# Altium schematic symbol library Regulator_Linear.SchLib: 1538 symbols (part 1 of 9) (continued)
## AP2127N-1.5
designator *  value AP2127N-1.5  Reference: U
ki_keywords: linear regulator ldo fixed positive; ki_description: 300mA low dropout linear regulator, shutdown pin, 2.5V-6V input voltage, 1.5V fixed positive output, SOT-23 package; ki_fp_filters: SOT?23*; Footprint: Package_TO_SOT_SMD:SOT-23; Datasheet: https://www.diodes.com/assets/Datasheets/AP2127.pdf
pins: 1 GND, 2 VO, 3 VI

## AP2127N-1.8
designator *  value AP2127N-1.8  Reference: U
ki_keywords: linear regulator ldo fixed positive; ki_description: 300mA low dropout linear regulator, shutdown pin, 2.5V-6V input voltage, 1.8V fixed positive output, SOT-23 package; ki_fp_filters: SOT?23*; Footprint: Package_TO_SOT_SMD:SOT-23; Datasheet: https://www.diodes.com/assets/Datasheets/AP2127.pdf
pins: 1 GND, 2 VO, 3 VI

## AP2127N-2.5
designator *  value AP2127N-2.5  Reference: U
ki_keywords: linear regulator ldo fixed positive; ki_description: 300mA low dropout linear regulator, shutdown pin, 2.5V-6V input voltage, 2.5V fixed positive output, SOT-23 package; ki_fp_filters: SOT?23*; Footprint: Package_TO_SOT_SMD:SOT-23; Datasheet: https://www.diodes.com/assets/Datasheets/AP2127.pdf
pins: 1 GND, 2 VO, 3 VI

## AP2127N-2.8
designator *  value AP2127N-2.8  Reference: U
ki_keywords: linear regulator ldo fixed positive; ki_description: 300mA low dropout linear regulator, shutdown pin, 2.5V-6V input voltage, 2.8V fixed positive output, SOT-23 package; ki_fp_filters: SOT?23*; Footprint: Package_TO_SOT_SMD:SOT-23; Datasheet: https://www.diodes.com/assets/Datasheets/AP2127.pdf
pins: 1 GND, 2 VO, 3 VI

## AP2127N-3.0
designator *  value AP2127N-3.0  Reference: U
ki_keywords: linear regulator ldo fixed positive; ki_description: 300mA low dropout linear regulator, shutdown pin, 2.5V-6V input voltage, 3.0V fixed positive output, SOT-23 package; ki_fp_filters: SOT?23*; Footprint: Package_TO_SOT_SMD:SOT-23; Datasheet: https://www.diodes.com/assets/Datasheets/AP2127.pdf
pins: 1 GND, 2 VO, 3 VI

## AP2127N-3.3
designator *  value AP2127N-3.3  Reference: U
ki_keywords: linear regulator ldo fixed positive; ki_description: 300mA low dropout linear regulator, shutdown pin, 2.5V-6V input voltage, 3.3V fixed positive output, SOT-23 package; ki_fp_filters: SOT?23*; Footprint: Package_TO_SOT_SMD:SOT-23; Datasheet: https://www.diodes.com/assets/Datasheets/AP2127.pdf
pins: 1 GND, 2 VO, 3 VI

## AP2127R-3.3
designator *  value AP2127R-3.3  Reference: U
ki_keywords: linear regulator ldo fixed positive; ki_description: 300mA low dropout linear regulator, shutdown pin, 2.5V-6V input voltage, 3.3V fixed positive output, SOT-89 package; ki_fp_filters: SOT?89*; Footprint: Package_TO_SOT_SMD:SOT-89-3; Datasheet: https://www.diodes.com/assets/Datasheets/AP2127.pdf
pins: 1 GND, 2 VI, 3 VO

## AP2204K-1.5
designator *  value AP2204K-1.5  Reference: U
ki_keywords: linear regulator ldo fixed positive; ki_description: 150mA low dropout linear regulator, wide input voltage range, 1.5V fixed positive output, SOT-23-5; ki_fp_filters: SOT?23?5*; Footprint: Package_TO_SOT_SMD:SOT-23-5; Datasheet: https://www.diodes.com/assets/Datasheets/AP2204.pdf
pins: 1 VIN, 2 GND, 3 EN, 4 NC hidden, 5 VOUT

## AP2204K-1.8
designator *  value AP2204K-1.8  Reference: U
ki_keywords: linear regulator ldo fixed positive; ki_description: 150mA low dropout linear regulator, wide input voltage range, 1.8V fixed positive output, SOT-23-5; ki_fp_filters: SOT?23?5*; Footprint: Package_TO_SOT_SMD:SOT-23-5; Datasheet: https://www.diodes.com/assets/Datasheets/AP2204.pdf
pins: 1 VIN, 2 GND, 3 EN, 4 NC hidden, 5 VOUT

## AP2204K-2.5
designator *  value AP2204K-2.5  Reference: U
ki_keywords: linear regulator ldo fixed positive; ki_description: 150mA low dropout linear regulator, wide input voltage range, 2.5V fixed positive output, SOT-23-5; ki_fp_filters: SOT?23?5*; Footprint: Package_TO_SOT_SMD:SOT-23-5; Datasheet: https://www.diodes.com/assets/Datasheets/AP2204.pdf
pins: 1 VIN, 2 GND, 3 EN, 4 NC hidden, 5 VOUT

## AP2204K-2.8
designator *  value AP2204K-2.8  Reference: U
ki_keywords: linear regulator ldo fixed positive; ki_description: 150mA low dropout linear regulator, wide input voltage range, 2.8V fixed positive output, SOT-23-5; ki_fp_filters: SOT?23?5*; Footprint: Package_TO_SOT_SMD:SOT-23-5; Datasheet: https://www.diodes.com/assets/Datasheets/AP2204.pdf
pins: 1 VIN, 2 GND, 3 EN, 4 NC hidden, 5 VOUT

## AP2204K-3.0
designator *  value AP2204K-3.0  Reference: U
ki_keywords: linear regulator ldo fixed positive; ki_description: 150mA low dropout linear regulator, wide input voltage range, 3.0V fixed positive output, SOT-23-5; ki_fp_filters: SOT?23?5*; Footprint: Package_TO_SOT_SMD:SOT-23-5; Datasheet: https://www.diodes.com/assets/Datasheets/AP2204.pdf
pins: 1 VIN, 2 GND, 3 EN, 4 NC hidden, 5 VOUT

## AP2204K-3.3
designator *  value AP2204K-3.3  Reference: U
ki_keywords: linear regulator ldo fixed positive; ki_description: 150mA low dropout linear regulator, wide input voltage range, 3.3V fixed positive output, SOT-23-5; ki_fp_filters: SOT?23?5*; Footprint: Package_TO_SOT_SMD:SOT-23-5; Datasheet: https://www.diodes.com/assets/Datasheets/AP2204.pdf
pins: 1 VIN, 2 GND, 3 EN, 4 NC hidden, 5 VOUT

## AP2204K-5.0
designator *  value AP2204K-5.0  Reference: U
ki_keywords: linear regulator ldo fixed positive; ki_description: 150mA low dropout linear regulator, wide input voltage range, 5.0V fixed positive output, SOT-23-5; ki_fp_filters: SOT?23?5*; Footprint: Package_TO_SOT_SMD:SOT-23-5; Datasheet: https://www.diodes.com/assets/Datasheets/AP2204.pdf
pins: 1 VIN, 2 GND, 3 EN, 4 NC hidden, 5 VOUT

## AP2204K-ADJ
designator *  value AP2204K-ADJ  Reference: U
ki_keywords: linear regulator ldo adjustable positive; ki_description: 150mA low dropout adjustable linear regulator, wide input voltage range, SOT-23-5 package; ki_fp_filters: SOT?23?5*; Footprint: Package_TO_SOT_SMD:SOT-23-5; Datasheet: https://www.diodes.com/assets/Datasheets/AP2204.pdf
pins: 1 VIN, 2 GND, 3 EN, 4 ADJ, 5 VOUT

## AP2204MP-ADJ
designator *  value AP2204MP-ADJ  Reference: U
ki_keywords: linear regulator ldo adjustable positive; ki_description: 150mA low dropout adjustable linear regulator, wide input voltage range, PSOP-8 package; ki_fp_filters: Diodes*PSOP*; Footprint: Package_SO:Diodes_PSOP-8; Datasheet: https://www.diodes.com/assets/Datasheets/AP2204.pdf
pins: 1 VOUT, 2 NC hidden, 3 NC hidden, 4 ADJ, 5 EN, 6 NC hidden, 7 GND, 8 VIN, 9 GND hidden

## AP2204R-1.5
designator *  value AP2204R-1.5  Reference: U
ki_keywords: linear regulator ldo fixed positive; ki_description: 150mA low dropout linear regulator, wide input voltage range, 1.5V fixed positive output, SOT-89-3 package; ki_fp_filters: SOT?89*; Footprint: Package_TO_SOT_SMD:SOT-89-3; Datasheet: https://www.diodes.com/assets/Datasheets/AP2204.pdf
pins: 1 VIN, 2 GND, 3 VOUT

## AP2204R-1.8
designator *  value AP2204R-1.8  Reference: U
ki_keywords: linear regulator ldo fixed positive; ki_description: 150mA low dropout linear regulator, wide input voltage range, 1.8V fixed positive output, SOT-89-3 package; ki_fp_filters: SOT?89*; Footprint: Package_TO_SOT_SMD:SOT-89-3; Datasheet: https://www.diodes.com/assets/Datasheets/AP2204.pdf
pins: 1 VIN, 2 GND, 3 VOUT

## AP2204R-2.5
designator *  value AP2204R-2.5  Reference: U
ki_keywords: linear regulator ldo fixed positive; ki_description: 150mA low dropout linear regulator, wide input voltage range, 2.5V fixed positive output, SOT-89-3 package; ki_fp_filters: SOT?89*; Footprint: Package_TO_SOT_SMD:SOT-89-3; Datasheet: https://www.diodes.com/assets/Datasheets/AP2204.pdf
pins: 1 VIN, 2 GND, 3 VOUT

## AP2204R-2.8
designator *  value AP2204R-2.8  Reference: U
ki_keywords: linear regulator ldo fixed positive; ki_description: 150mA low dropout linear regulator, wide input voltage range, 2.8V fixed positive output, SOT-89-3 package; ki_fp_filters: SOT?89*; Footprint: Package_TO_SOT_SMD:SOT-89-3; Datasheet: https://www.diodes.com/assets/Datasheets/AP2204.pdf
pins: 1 VIN, 2 GND, 3 VOUT

## AP2204R-3.0
designator *  value AP2204R-3.0  Reference: U
ki_keywords: linear regulator ldo fixed positive; ki_description: 150mA low dropout linear regulator, wide input voltage range, 3.0V fixed positive output, SOT-89-3 package; ki_fp_filters: SOT?89*; Footprint: Package_TO_SOT_SMD:SOT-89-3; Datasheet: https://www.diodes.com/assets/Datasheets/AP2204.pdf
pins: 1 VIN, 2 GND, 3 VOUT

## AP2204R-3.3
designator *  value AP2204R-3.3  Reference: U
ki_keywords: linear regulator ldo fixed positive; ki_description: 150mA low dropout linear regulator, wide input voltage range, 3.3V fixed positive output, SOT-89-3 package; ki_fp_filters: SOT?89*; Footprint: Package_TO_SOT_SMD:SOT-89-3; Datasheet: https://www.diodes.com/assets/Datasheets/AP2204.pdf
pins: 1 VIN, 2 GND, 3 VOUT

## AP2204R-5.0
designator *  value AP2204R-5.0  Reference: U
ki_keywords: linear regulator ldo fixed positive; ki_description: 150mA low dropout linear regulator, wide input voltage range, 5.0V fixed positive output, SOT-89-3 package; ki_fp_filters: SOT?89*; Footprint: Package_TO_SOT_SMD:SOT-89-3; Datasheet: https://www.diodes.com/assets/Datasheets/AP2204.pdf
pins: 1 VIN, 2 GND, 3 VOUT

## AP2204RA-3.3
designator *  value AP2204RA-3.3  Reference: U
ki_keywords: linear regulator ldo fixed positive; ki_description: 150mA low dropout linear regulator, wide input voltage range, 3.3V fixed positive output, SOT-89-3 package; ki_fp_filters: SOT?89*; Footprint: Package_TO_SOT_SMD:SOT-89-3; Datasheet: https://www.diodes.com/assets/Datasheets/AP2204.pdf
pins: 1 GND, 2 VIN, 3 VOUT

## AP2204RA-5.0
designator *  value AP2204RA-5.0  Reference: U
ki_keywords: linear regulator ldo fixed positive; ki_description: 150mA low dropout linear regulator, wide input voltage range, 5.0V fixed positive output, SOT-89-3 package; ki_fp_filters: SOT?89*; Footprint: Package_TO_SOT_SMD:SOT-89-3; Datasheet: https://www.diodes.com/assets/Datasheets/AP2204.pdf
pins: 1 GND, 2 VIN, 3 VOUT

## AP2204RB-3.3
designator *  value AP2204RB-3.3  Reference: U
ki_keywords: linear regulator ldo fixed positive; ki_description: 150mA low dropout linear regulator, wide input voltage range, 3.3V fixed positive output, SOT-89-3 package; ki_fp_filters: SOT?89*; Footprint: Package_TO_SOT_SMD:SOT-89-3; Datasheet: https://www.diodes.com/assets/Datasheets/AP2204.pdf
pins: 1 VOUT, 2 GND, 3 VIN

## AP2204RB-5.0
designator *  value AP2204RB-5.0  Reference: U
ki_keywords: linear regulator ldo fixed positive; ki_description: 150mA low dropout linear regulator, wide input voltage range, 5.0V fixed positive output, SOT-89-3 package; ki_fp_filters: SOT?89*; Footprint: Package_TO_SOT_SMD:SOT-89-3; Datasheet: https://www.diodes.com/assets/Datasheets/AP2204.pdf
pins: 1 VOUT, 2 GND, 3 VIN

## AP7361C-10E
designator *  value AP7361C-10E  Reference: U
ki_keywords: linear regulator ldo fixed positive; ki_description: 1A Low Dropout regulator, positive, 1.0V fixed output, SOT-223; ki_fp_filters: SOT?223*; Footprint: Package_TO_SOT_SMD:SOT-223-3_TabPin2; Datasheet: https://www.diodes.com/assets/Datasheets/AP7361C.pdf
pins: 1 VI, 2 GND, 3 VO

## AP7361C-12E
designator *  value AP7361C-12E  Reference: U
ki_keywords: linear regulator ldo fixed positive; ki_description: 1A Low Dropout regulator, positive, 1.2V fixed output, SOT-223; ki_fp_filters: SOT?223*; Footprint: Package_TO_SOT_SMD:SOT-223-3_TabPin2; Datasheet: https://www.diodes.com/assets/Datasheets/AP7361C.pdf
pins: 1 VI, 2 GND, 3 VO

## AP7361C-15E
designator *  value AP7361C-15E  Reference: U
ki_keywords: linear regulator ldo fixed positive; ki_description: 1A Low Dropout regulator, positive, 1.5V fixed output, SOT-223; ki_fp_filters: SOT?223*; Footprint: Package_TO_SOT_SMD:SOT-223-3_TabPin2; Datasheet: https://www.diodes.com/assets/Datasheets/AP7361C.pdf
pins: 1 VI, 2 GND, 3 VO

## AP7361C-18E
designator *  value AP7361C-18E  Reference: U
ki_keywords: linear regulator ldo fixed positive; ki_description: 1A Low Dropout regulator, positive, 1.8V fixed output, SOT-223; ki_fp_filters: SOT?223*; Footprint: Package_TO_SOT_SMD:SOT-223-3_TabPin2; Datasheet: https://www.diodes.com/assets/Datasheets/AP7361C.pdf
pins: 1 VI, 2 GND, 3 VO

## AP7361C-25E
designator *  value AP7361C-25E  Reference: U
ki_keywords: linear regulator ldo fixed positive; ki_description: 1A Low Dropout regulator, positive, 2.5V fixed output, SOT-223; ki_fp_filters: SOT?223*; Footprint: Package_TO_SOT_SMD:SOT-223-3_TabPin2; Datasheet: https://www.diodes.com/assets/Datasheets/AP7361C.pdf
pins: 1 VI, 2 GND, 3 VO

## AP7361C-28E
designator *  value AP7361C-28E  Reference: U
ki_keywords: linear regulator ldo fixed positive; ki_description: 1A Low Dropout regulator, positive, 2.8V fixed output, SOT-223; ki_fp_filters: SOT?223*; Footprint: Package_TO_SOT_SMD:SOT-223-3_TabPin2; Datasheet: https://www.diodes.com/assets/Datasheets/AP7361C.pdf
pins: 1 VI, 2 GND, 3 VO

## AP7361C-33E
designator *  value AP7361C-33E  Reference: U
ki_keywords: linear regulator ldo fixed positive; ki_description: 1A Low Dropout regulator, positive, 3.3V fixed output, SOT-223; ki_fp_filters: SOT?223*; Footprint: Package_TO_SOT_SMD:SOT-223-3_TabPin2; Datasheet: https://www.diodes.com/assets/Datasheets/AP7361C.pdf
pins: 1 VI, 2 GND, 3 VO

## AP7370-12FDC
designator *  value AP7370-12FDC  Reference: U
ki_keywords: linear regulator ldo fixed positive; ki_description: 200mA Low-Dropout Linear Regulator, 1.2V fixed output, DFN-6; ki_fp_filters: DFN*2x2mm*P0.65mm*; Footprint: Package_DFN_QFN:DFN-6-1EP_2x2mm_P0.65mm_EP1.01x1.7mm; Datasheet: https://www.diodes.com/assets/Datasheets/AP7370.pdf
pins: 1 VO, 2 NC hidden, 3 GND, 4 NC hidden, 5 NC hidden, 6 VI, 7 GND hidden

## AP7370-15FDC
designator *  value AP7370-15FDC  Reference: U
ki_keywords: linear regulator ldo fixed positive; ki_description: 200mA Low-Dropout Linear Regulator, 1.5V fixed output, DFN-6; ki_fp_filters: DFN*2x2mm*P0.65mm*; Footprint: Package_DFN_QFN:DFN-6-1EP_2x2mm_P0.65mm_EP1.01x1.7mm; Datasheet: https://www.diodes.com/assets/Datasheets/AP7370.pdf
pins: 1 VO, 2 NC hidden, 3 GND, 4 NC hidden, 5 NC hidden, 6 VI, 7 GND hidden

## AP7370-18FDC
designator *  value AP7370-18FDC  Reference: U
ki_keywords: linear regulator ldo fixed positive; ki_description: 200mA Low-Dropout Linear Regulator, 1.8V fixed output, DFN-6; ki_fp_filters: DFN*2x2mm*P0.65mm*; Footprint: Package_DFN_QFN:DFN-6-1EP_2x2mm_P0.65mm_EP1.01x1.7mm; Datasheet: https://www.diodes.com/assets/Datasheets/AP7370.pdf
pins: 1 VO, 2 NC hidden, 3 GND, 4 NC hidden, 5 NC hidden, 6 VI, 7 GND hidden

## AP7370-28FDC
designator *  value AP7370-28FDC  Reference: U
ki_keywords: linear regulator ldo fixed positive; ki_description: 350mA Low-Dropout Linear Regulator, 2.8V fixed output, DFN-6; ki_fp_filters: DFN*2x2mm*P0.65mm*; Footprint: Package_DFN_QFN:DFN-6-1EP_2x2mm_P0.65mm_EP1.01x1.7mm; Datasheet: https://www.diodes.com/assets/Datasheets/AP7370.pdf
pins: 1 VO, 2 NC hidden, 3 GND, 4 NC hidden, 5 NC hidden, 6 VI, 7 GND hidden

## AP7370-30FDC
designator *  value AP7370-30FDC  Reference: U
ki_keywords: linear regulator ldo fixed positive; ki_description: 350mA Low-Dropout Linear Regulator, 3.0V fixed output, DFN-6; ki_fp_filters: DFN*2x2mm*P0.65mm*; Footprint: Package_DFN_QFN:DFN-6-1EP_2x2mm_P0.65mm_EP1.01x1.7mm; Datasheet: https://www.diodes.com/assets/Datasheets/AP7370.pdf
pins: 1 VO, 2 NC hidden, 3 GND, 4 NC hidden, 5 NC hidden, 6 VI, 7 GND hidden

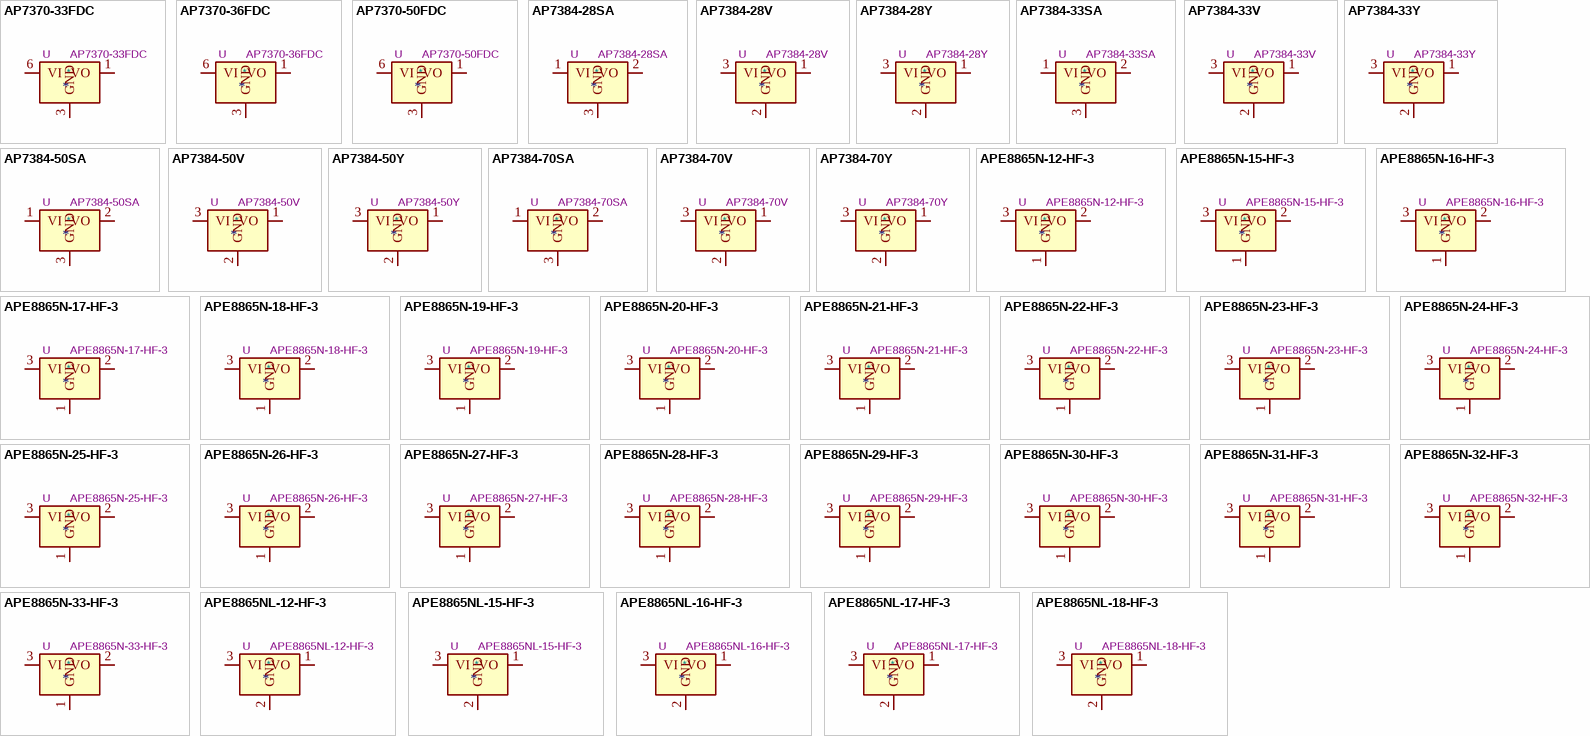
[diagram p3: symbols AP7370-33FDC to APE8865NL-18-HF-3]

## AP7370-33FDC
designator *  value AP7370-33FDC  Reference: U
ki_keywords: linear regulator ldo fixed positive; ki_description: 350mA Low-Dropout Linear Regulator, 3.3V fixed output, DFN-6; ki_fp_filters: DFN*2x2mm*P0.65mm*; Footprint: Package_DFN_QFN:DFN-6-1EP_2x2mm_P0.65mm_EP1.01x1.7mm; Datasheet: https://www.diodes.com/assets/Datasheets/AP7370.pdf
pins: 1 VO, 2 NC hidden, 3 GND, 4 NC hidden, 5 NC hidden, 6 VI, 7 GND hidden

## AP7370-36FDC
designator *  value AP7370-36FDC  Reference: U
ki_keywords: linear regulator ldo fixed positive; ki_description: 350mA Low-Dropout Linear Regulator, 3.6V fixed output, DFN-6; ki_fp_filters: DFN*2x2mm*P0.65mm*; Footprint: Package_DFN_QFN:DFN-6-1EP_2x2mm_P0.65mm_EP1.01x1.7mm; Datasheet: https://www.diodes.com/assets/Datasheets/AP7370.pdf
pins: 1 VO, 2 NC hidden, 3 GND, 4 NC hidden, 5 NC hidden, 6 VI, 7 GND hidden

## AP7370-50FDC
designator *  value AP7370-50FDC  Reference: U
ki_keywords: linear regulator ldo fixed positive; ki_description: 350mA Low-Dropout Linear Regulator, 5.0V fixed output, DFN-6; ki_fp_filters: DFN*2x2mm*P0.65mm*; Footprint: Package_DFN_QFN:DFN-6-1EP_2x2mm_P0.65mm_EP1.01x1.7mm; Datasheet: https://www.diodes.com/assets/Datasheets/AP7370.pdf
pins: 1 VO, 2 NC hidden, 3 GND, 4 NC hidden, 5 NC hidden, 6 VI, 7 GND hidden

## AP7384-28SA
designator *  value AP7384-28SA  Reference: U
ki_keywords: 50mA LDO Regulator Fixed Positive; ki_description: 50mA Low Dropout Voltage Regulator, Fixed Output 2.8V, Wide Input Voltage Range 40V, SOT-23; ki_fp_filters: SOT?23*; Footprint: Package_TO_SOT_SMD:SOT-23; Datasheet: https://www.diodes.com/assets/Datasheets/AP7384.pdf
pins: 1 VI, 2 VO, 3 GND

## AP7384-28V
designator *  value AP7384-28V  Reference: U
ki_keywords: 50mA LDO Regulator Fixed Positive; ki_description: 50mA Low Dropout Voltage Regulator, Fixed Output 2.8V, Wide Input Voltage Range 40V, TO-92; ki_fp_filters: TO?92*; Footprint: Package_TO_SOT_THT:TO-92_Inline_Wide; Datasheet: https://www.diodes.com/assets/Datasheets/AP7384.pdf
pins: 1 VO, 2 GND, 3 VI

## AP7384-28Y
designator *  value AP7384-28Y  Reference: U
ki_keywords: 50mA LDO Regulator Fixed Positive; ki_description: 50mA Low Dropout Voltage Regulator, Fixed Output 2.8V, Wide Input Voltage Range 40V, SOT-89-3; ki_fp_filters: SOT?89?3*; Footprint: Package_TO_SOT_SMD:SOT-89-3; Datasheet: https://www.diodes.com/assets/Datasheets/AP7384.pdf
pins: 1 VO, 2 GND, 3 VI

## AP7384-33SA
designator *  value AP7384-33SA  Reference: U
ki_keywords: 50mA LDO Regulator Fixed Positive; ki_description: 50mA Low Dropout Voltage Regulator, Fixed Output 3.3V, Wide Input Voltage Range 40V, SOT-23; ki_fp_filters: SOT?23*; Footprint: Package_TO_SOT_SMD:SOT-23; Datasheet: https://www.diodes.com/assets/Datasheets/AP7384.pdf
pins: 1 VI, 2 VO, 3 GND

## AP7384-33V
designator *  value AP7384-33V  Reference: U
ki_keywords: 50mA LDO Regulator Fixed Positive; ki_description: 50mA Low Dropout Voltage Regulator, Fixed Output 3.3V, Wide Input Voltage Range 40V, TO-92; ki_fp_filters: TO?92*; Footprint: Package_TO_SOT_THT:TO-92_Inline_Wide; Datasheet: https://www.diodes.com/assets/Datasheets/AP7384.pdf
pins: 1 VO, 2 GND, 3 VI

## AP7384-33Y
designator *  value AP7384-33Y  Reference: U
ki_keywords: 50mA LDO Regulator Fixed Positive; ki_description: 50mA Low Dropout Voltage Regulator, Fixed Output 3.3V, Wide Input Voltage Range 40V, SOT-89-3; ki_fp_filters: SOT?89?3*; Footprint: Package_TO_SOT_SMD:SOT-89-3; Datasheet: https://www.diodes.com/assets/Datasheets/AP7384.pdf
pins: 1 VO, 2 GND, 3 VI

## AP7384-50SA
designator *  value AP7384-50SA  Reference: U
ki_keywords: 50mA LDO Regulator Fixed Positive; ki_description: 50mA Low Dropout Voltage Regulator, Fixed Output 5V, Wide Input Voltage Range 40V, SOT-23; ki_fp_filters: SOT?23*; Footprint: Package_TO_SOT_SMD:SOT-23; Datasheet: https://www.diodes.com/assets/Datasheets/AP7384.pdf
pins: 1 VI, 2 VO, 3 GND

## AP7384-50V
designator *  value AP7384-50V  Reference: U
ki_keywords: 50mA LDO Regulator Fixed Positive; ki_description: 50mA Low Dropout Voltage Regulator, Fixed Output 5V, Wide Input Voltage Range 40V, TO-92; ki_fp_filters: TO?92*; Footprint: Package_TO_SOT_THT:TO-92_Inline_Wide; Datasheet: https://www.diodes.com/assets/Datasheets/AP7384.pdf
pins: 1 VO, 2 GND, 3 VI

## AP7384-50Y
designator *  value AP7384-50Y  Reference: U
ki_keywords: 50mA LDO Regulator Fixed Positive; ki_description: 50mA Low Dropout Voltage Regulator, Fixed Output 5V, Wide Input Voltage Range 40V, SOT-89-3; ki_fp_filters: SOT?89?3*; Footprint: Package_TO_SOT_SMD:SOT-89-3; Datasheet: https://www.diodes.com/assets/Datasheets/AP7384.pdf
pins: 1 VO, 2 GND, 3 VI

## AP7384-70SA
designator *  value AP7384-70SA  Reference: U
ki_keywords: 50mA LDO Regulator Fixed Positive; ki_description: 50mA Low Dropout Voltage Regulator, Fixed Output 7V, Wide Input Voltage Range 40V, SOT-23; ki_fp_filters: SOT?23*; Footprint: Package_TO_SOT_SMD:SOT-23; Datasheet: https://www.diodes.com/assets/Datasheets/AP7384.pdf
pins: 1 VI, 2 VO, 3 GND

## AP7384-70V
designator *  value AP7384-70V  Reference: U
ki_keywords: 50mA LDO Regulator Fixed Positive; ki_description: 50mA Low Dropout Voltage Regulator, Fixed Output 7V, Wide Input Voltage Range 40V, TO-92; ki_fp_filters: TO?92*; Footprint: Package_TO_SOT_THT:TO-92_Inline_Wide; Datasheet: https://www.diodes.com/assets/Datasheets/AP7384.pdf
pins: 1 VO, 2 GND, 3 VI

## AP7384-70Y
designator *  value AP7384-70Y  Reference: U
ki_keywords: 50mA LDO Regulator Fixed Positive; ki_description: 50mA Low Dropout Voltage Regulator, Fixed Output 7V, Wide Input Voltage Range 40V, SOT-89-3; ki_fp_filters: SOT?89?3*; Footprint: Package_TO_SOT_SMD:SOT-89-3; Datasheet: https://www.diodes.com/assets/Datasheets/AP7384.pdf
pins: 1 VO, 2 GND, 3 VI

## APE8865N-12-HF-3
designator *  value APE8865N-12-HF-3  Reference: U
ki_keywords: 300mA LDO Regulator Fixed Positive; ki_description: 300mA Low Dropout Voltage Regulator, Fixed Output 1.2V, SOT-23; ki_fp_filters: SOT?23*; Footprint: Package_TO_SOT_SMD:SOT-23; Datasheet: http://www.tme.eu/fr/Document/ced3461ed31ea70a3c416fb648e0cde7/APE8865-3.pdf
pins: 1 GND, 2 VO, 3 VI

## APE8865N-15-HF-3
designator *  value APE8865N-15-HF-3  Reference: U
ki_keywords: 300mA LDO Regulator Fixed Positive; ki_description: 300mA Low Dropout Voltage Regulator, Fixed Output 1.5V, SOT-23; ki_fp_filters: SOT?23*; Footprint: Package_TO_SOT_SMD:SOT-23; Datasheet: http://www.tme.eu/fr/Document/ced3461ed31ea70a3c416fb648e0cde7/APE8865-3.pdf
pins: 1 GND, 2 VO, 3 VI

## APE8865N-16-HF-3
designator *  value APE8865N-16-HF-3  Reference: U
ki_keywords: 300mA LDO Regulator Fixed Positive; ki_description: 300mA Low Dropout Voltage Regulator, Fixed Output 1.6V, SOT-23; ki_fp_filters: SOT?23*; Footprint: Package_TO_SOT_SMD:SOT-23; Datasheet: http://www.tme.eu/fr/Document/ced3461ed31ea70a3c416fb648e0cde7/APE8865-3.pdf
pins: 1 GND, 2 VO, 3 VI

## APE8865N-17-HF-3
designator *  value APE8865N-17-HF-3  Reference: U
ki_keywords: 300mA LDO Regulator Fixed Positive; ki_description: 300mA Low Dropout Voltage Regulator, Fixed Output 1.7V, SOT-23; ki_fp_filters: SOT?23*; Footprint: Package_TO_SOT_SMD:SOT-23; Datasheet: http://www.tme.eu/fr/Document/ced3461ed31ea70a3c416fb648e0cde7/APE8865-3.pdf
pins: 1 GND, 2 VO, 3 VI

## APE8865N-18-HF-3
designator *  value APE8865N-18-HF-3  Reference: U
ki_keywords: 300mA LDO Regulator Fixed Positive; ki_description: 300mA Low Dropout Voltage Regulator, Fixed Output 1.8V, SOT-23; ki_fp_filters: SOT?23*; Footprint: Package_TO_SOT_SMD:SOT-23; Datasheet: http://www.tme.eu/fr/Document/ced3461ed31ea70a3c416fb648e0cde7/APE8865-3.pdf
pins: 1 GND, 2 VO, 3 VI

## APE8865N-19-HF-3
designator *  value APE8865N-19-HF-3  Reference: U
ki_keywords: 300mA LDO Regulator Fixed Positive; ki_description: 300mA Low Dropout Voltage Regulator, Fixed Output 1.9V, SOT-23; ki_fp_filters: SOT?23*; Footprint: Package_TO_SOT_SMD:SOT-23; Datasheet: http://www.tme.eu/fr/Document/ced3461ed31ea70a3c416fb648e0cde7/APE8865-3.pdf
pins: 1 GND, 2 VO, 3 VI

## APE8865N-20-HF-3
designator *  value APE8865N-20-HF-3  Reference: U
ki_keywords: 300mA LDO Regulator Fixed Positive; ki_description: 300mA Low Dropout Voltage Regulator, Fixed Output 2.0V, SOT-23; ki_fp_filters: SOT?23*; Footprint: Package_TO_SOT_SMD:SOT-23; Datasheet: http://www.tme.eu/fr/Document/ced3461ed31ea70a3c416fb648e0cde7/APE8865-3.pdf
pins: 1 GND, 2 VO, 3 VI

## APE8865N-21-HF-3
designator *  value APE8865N-21-HF-3  Reference: U
ki_keywords: 300mA LDO Regulator Fixed Positive; ki_description: 300mA Low Dropout Voltage Regulator, Fixed Output 2.1V, SOT-23; ki_fp_filters: SOT?23*; Footprint: Package_TO_SOT_SMD:SOT-23; Datasheet: http://www.tme.eu/fr/Document/ced3461ed31ea70a3c416fb648e0cde7/APE8865-3.pdf
pins: 1 GND, 2 VO, 3 VI

## APE8865N-22-HF-3
designator *  value APE8865N-22-HF-3  Reference: U
ki_keywords: 300mA LDO Regulator Fixed Positive; ki_description: 300mA Low Dropout Voltage Regulator, Fixed Output 2.2V, SOT-23; ki_fp_filters: SOT?23*; Footprint: Package_TO_SOT_SMD:SOT-23; Datasheet: http://www.tme.eu/fr/Document/ced3461ed31ea70a3c416fb648e0cde7/APE8865-3.pdf
pins: 1 GND, 2 VO, 3 VI

## APE8865N-23-HF-3
designator *  value APE8865N-23-HF-3  Reference: U
ki_keywords: 300mA LDO Regulator Fixed Positive; ki_description: 300mA Low Dropout Voltage Regulator, Fixed Output 2.3V, SOT-23; ki_fp_filters: SOT?23*; Footprint: Package_TO_SOT_SMD:SOT-23; Datasheet: http://www.tme.eu/fr/Document/ced3461ed31ea70a3c416fb648e0cde7/APE8865-3.pdf
pins: 1 GND, 2 VO, 3 VI

## APE8865N-24-HF-3
designator *  value APE8865N-24-HF-3  Reference: U
ki_keywords: 300mA LDO Regulator Fixed Positive; ki_description: 300mA Low Dropout Voltage Regulator, Fixed Output 2.4V, SOT-23; ki_fp_filters: SOT?23*; Footprint: Package_TO_SOT_SMD:SOT-23; Datasheet: http://www.tme.eu/fr/Document/ced3461ed31ea70a3c416fb648e0cde7/APE8865-3.pdf
pins: 1 GND, 2 VO, 3 VI

## APE8865N-25-HF-3
designator *  value APE8865N-25-HF-3  Reference: U
ki_keywords: 300mA LDO Regulator Fixed Positive; ki_description: 300mA Low Dropout Voltage Regulator, Fixed Output 2.5V, SOT-23; ki_fp_filters: SOT?23*; Footprint: Package_TO_SOT_SMD:SOT-23; Datasheet: http://www.tme.eu/fr/Document/ced3461ed31ea70a3c416fb648e0cde7/APE8865-3.pdf
pins: 1 GND, 2 VO, 3 VI

## APE8865N-26-HF-3
designator *  value APE8865N-26-HF-3  Reference: U
ki_keywords: 300mA LDO Regulator Fixed Positive; ki_description: 300mA Low Dropout Voltage Regulator, Fixed Output 2.6V, SOT-23; ki_fp_filters: SOT?23*; Footprint: Package_TO_SOT_SMD:SOT-23; Datasheet: http://www.tme.eu/fr/Document/ced3461ed31ea70a3c416fb648e0cde7/APE8865-3.pdf
pins: 1 GND, 2 VO, 3 VI

## APE8865N-27-HF-3
designator *  value APE8865N-27-HF-3  Reference: U
ki_keywords: 300mA LDO Regulator Fixed Positive; ki_description: 300mA Low Dropout Voltage Regulator, Fixed Output 2.7V, SOT-23; ki_fp_filters: SOT?23*; Footprint: Package_TO_SOT_SMD:SOT-23; Datasheet: http://www.tme.eu/fr/Document/ced3461ed31ea70a3c416fb648e0cde7/APE8865-3.pdf
pins: 1 GND, 2 VO, 3 VI

## APE8865N-28-HF-3
designator *  value APE8865N-28-HF-3  Reference: U
ki_keywords: 300mA LDO Regulator Fixed Positive; ki_description: 300mA Low Dropout Voltage Regulator, Fixed Output 2.8V, SOT-23; ki_fp_filters: SOT?23*; Footprint: Package_TO_SOT_SMD:SOT-23; Datasheet: http://www.tme.eu/fr/Document/ced3461ed31ea70a3c416fb648e0cde7/APE8865-3.pdf
pins: 1 GND, 2 VO, 3 VI

## APE8865N-29-HF-3
designator *  value APE8865N-29-HF-3  Reference: U
ki_keywords: 300mA LDO Regulator Fixed Positive; ki_description: 300mA Low Dropout Voltage Regulator, Fixed Output 2.9V, SOT-23; ki_fp_filters: SOT?23*; Footprint: Package_TO_SOT_SMD:SOT-23; Datasheet: http://www.tme.eu/fr/Document/ced3461ed31ea70a3c416fb648e0cde7/APE8865-3.pdf
pins: 1 GND, 2 VO, 3 VI

## APE8865N-30-HF-3
designator *  value APE8865N-30-HF-3  Reference: U
ki_keywords: 300mA LDO Regulator Fixed Positive; ki_description: 300mA Low Dropout Voltage Regulator, Fixed Output 3.0V, SOT-23; ki_fp_filters: SOT?23*; Footprint: Package_TO_SOT_SMD:SOT-23; Datasheet: http://www.tme.eu/fr/Document/ced3461ed31ea70a3c416fb648e0cde7/APE8865-3.pdf
pins: 1 GND, 2 VO, 3 VI

## APE8865N-31-HF-3
designator *  value APE8865N-31-HF-3  Reference: U
ki_keywords: 300mA LDO Regulator Fixed Positive; ki_description: 300mA Low Dropout Voltage Regulator, Fixed Output 3.1V, SOT-23; ki_fp_filters: SOT?23*; Footprint: Package_TO_SOT_SMD:SOT-23; Datasheet: http://www.tme.eu/fr/Document/ced3461ed31ea70a3c416fb648e0cde7/APE8865-3.pdf
pins: 1 GND, 2 VO, 3 VI

## APE8865N-32-HF-3
designator *  value APE8865N-32-HF-3  Reference: U
ki_keywords: 300mA LDO Regulator Fixed Positive; ki_description: 300mA Low Dropout Voltage Regulator, Fixed Output 3.2V, SOT-23; ki_fp_filters: SOT?23*; Footprint: Package_TO_SOT_SMD:SOT-23; Datasheet: http://www.tme.eu/fr/Document/ced3461ed31ea70a3c416fb648e0cde7/APE8865-3.pdf
pins: 1 GND, 2 VO, 3 VI

## APE8865N-33-HF-3
designator *  value APE8865N-33-HF-3  Reference: U
ki_keywords: 300mA LDO Regulator Fixed Positive; ki_description: 300mA Low Dropout Voltage Regulator, Fixed Output 3.3V, SOT-23; ki_fp_filters: SOT?23*; Footprint: Package_TO_SOT_SMD:SOT-23; Datasheet: http://www.tme.eu/fr/Document/ced3461ed31ea70a3c416fb648e0cde7/APE8865-3.pdf
pins: 1 GND, 2 VO, 3 VI

## APE8865NL-12-HF-3
designator *  value APE8865NL-12-HF-3  Reference: U
ki_keywords: 300mA LDO Regulator Fixed Positive; ki_description: 300mA Low Dropout Voltage Regulator, Fixed Output 1.2V, SOT-23; ki_fp_filters: SOT?23*; Footprint: Package_TO_SOT_SMD:SOT-23; Datasheet: http://www.tme.eu/fr/Document/ced3461ed31ea70a3c416fb648e0cde7/APE8865-3.pdf
pins: 1 VO, 2 GND, 3 VI

## APE8865NL-15-HF-3
designator *  value APE8865NL-15-HF-3  Reference: U
ki_keywords: 300mA LDO Regulator Fixed Positive; ki_description: 300mA Low Dropout Voltage Regulator, Fixed Output 1.5V, SOT-23; ki_fp_filters: SOT?23*; Footprint: Package_TO_SOT_SMD:SOT-23; Datasheet: http://www.tme.eu/fr/Document/ced3461ed31ea70a3c416fb648e0cde7/APE8865-3.pdf
pins: 1 VO, 2 GND, 3 VI

## APE8865NL-16-HF-3
designator *  value APE8865NL-16-HF-3  Reference: U
ki_keywords: 300mA LDO Regulator Fixed Positive; ki_description: 300mA Low Dropout Voltage Regulator, Fixed Output 1.6V, SOT-23; ki_fp_filters: SOT?23*; Footprint: Package_TO_SOT_SMD:SOT-23; Datasheet: http://www.tme.eu/fr/Document/ced3461ed31ea70a3c416fb648e0cde7/APE8865-3.pdf
pins: 1 VO, 2 GND, 3 VI

## APE8865NL-17-HF-3
designator *  value APE8865NL-17-HF-3  Reference: U
ki_keywords: 300mA LDO Regulator Fixed Positive; ki_description: 300mA Low Dropout Voltage Regulator, Fixed Output 1.7V, SOT-23; ki_fp_filters: SOT?23*; Footprint: Package_TO_SOT_SMD:SOT-23; Datasheet: http://www.tme.eu/fr/Document/ced3461ed31ea70a3c416fb648e0cde7/APE8865-3.pdf
pins: 1 VO, 2 GND, 3 VI

## APE8865NL-18-HF-3
designator *  value APE8865NL-18-HF-3  Reference: U
ki_keywords: 300mA LDO Regulator Fixed Positive; ki_description: 300mA Low Dropout Voltage Regulator, Fixed Output 1.8V, SOT-23; ki_fp_filters: SOT?23*; Footprint: Package_TO_SOT_SMD:SOT-23; Datasheet: http://www.tme.eu/fr/Document/ced3461ed31ea70a3c416fb648e0cde7/APE8865-3.pdf
pins: 1 VO, 2 GND, 3 VI

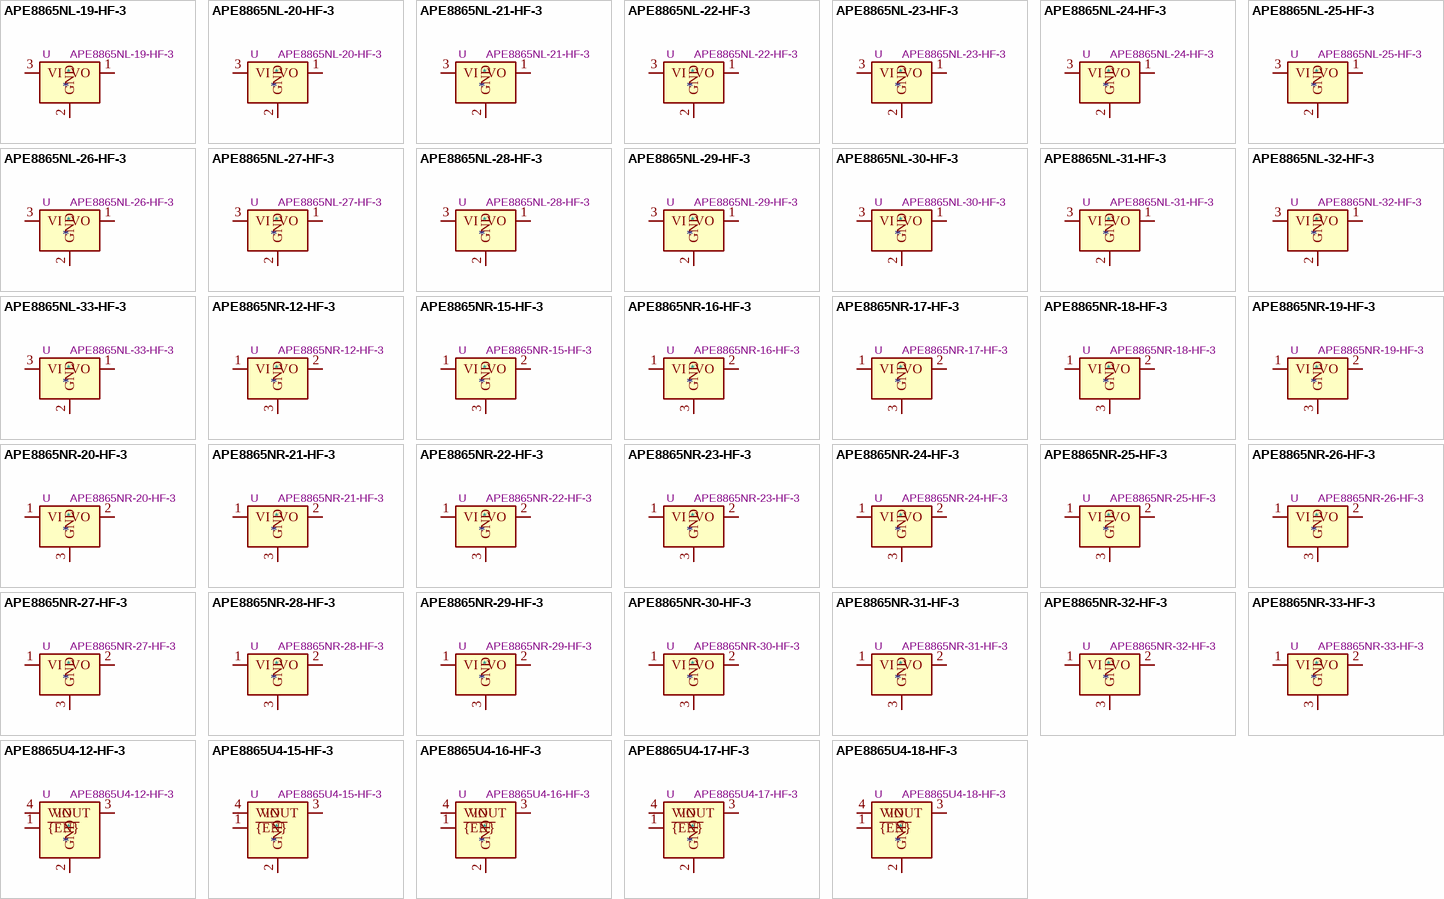
[diagram p4: symbols APE8865NL-19-HF-3 to APE8865U4-18-HF-3]

## APE8865NL-19-HF-3
designator *  value APE8865NL-19-HF-3  Reference: U
ki_keywords: 300mA LDO Regulator Fixed Positive; ki_description: 300mA Low Dropout Voltage Regulator, Fixed Output 1.9V, SOT-23; ki_fp_filters: SOT?23*; Footprint: Package_TO_SOT_SMD:SOT-23; Datasheet: http://www.tme.eu/fr/Document/ced3461ed31ea70a3c416fb648e0cde7/APE8865-3.pdf
pins: 1 VO, 2 GND, 3 VI

## APE8865NL-20-HF-3
designator *  value APE8865NL-20-HF-3  Reference: U
ki_keywords: 300mA LDO Regulator Fixed Positive; ki_description: 300mA Low Dropout Voltage Regulator, Fixed Output 2.0V, SOT-23; ki_fp_filters: SOT?23*; Footprint: Package_TO_SOT_SMD:SOT-23; Datasheet: http://www.tme.eu/fr/Document/ced3461ed31ea70a3c416fb648e0cde7/APE8865-3.pdf
pins: 1 VO, 2 GND, 3 VI

## APE8865NL-21-HF-3
designator *  value APE8865NL-21-HF-3  Reference: U
ki_keywords: 300mA LDO Regulator Fixed Positive; ki_description: 300mA Low Dropout Voltage Regulator, Fixed Output 2.1V, SOT-23; ki_fp_filters: SOT?23*; Footprint: Package_TO_SOT_SMD:SOT-23; Datasheet: http://www.tme.eu/fr/Document/ced3461ed31ea70a3c416fb648e0cde7/APE8865-3.pdf
pins: 1 VO, 2 GND, 3 VI

## APE8865NL-22-HF-3
designator *  value APE8865NL-22-HF-3  Reference: U
ki_keywords: 300mA LDO Regulator Fixed Positive; ki_description: 300mA Low Dropout Voltage Regulator, Fixed Output 2.2V, SOT-23; ki_fp_filters: SOT?23*; Footprint: Package_TO_SOT_SMD:SOT-23; Datasheet: http://www.tme.eu/fr/Document/ced3461ed31ea70a3c416fb648e0cde7/APE8865-3.pdf
pins: 1 VO, 2 GND, 3 VI

## APE8865NL-23-HF-3
designator *  value APE8865NL-23-HF-3  Reference: U
ki_keywords: 300mA LDO Regulator Fixed Positive; ki_description: 300mA Low Dropout Voltage Regulator, Fixed Output 2.3V, SOT-23; ki_fp_filters: SOT?23*; Footprint: Package_TO_SOT_SMD:SOT-23; Datasheet: http://www.tme.eu/fr/Document/ced3461ed31ea70a3c416fb648e0cde7/APE8865-3.pdf
pins: 1 VO, 2 GND, 3 VI

## APE8865NL-24-HF-3
designator *  value APE8865NL-24-HF-3  Reference: U
ki_keywords: 300mA LDO Regulator Fixed Positive; ki_description: 300mA Low Dropout Voltage Regulator, Fixed Output 2.4V, SOT-23; ki_fp_filters: SOT?23*; Footprint: Package_TO_SOT_SMD:SOT-23; Datasheet: http://www.tme.eu/fr/Document/ced3461ed31ea70a3c416fb648e0cde7/APE8865-3.pdf
pins: 1 VO, 2 GND, 3 VI

## APE8865NL-25-HF-3
designator *  value APE8865NL-25-HF-3  Reference: U
ki_keywords: 300mA LDO Regulator Fixed Positive; ki_description: 300mA Low Dropout Voltage Regulator, Fixed Output 2.5V, SOT-23; ki_fp_filters: SOT?23*; Footprint: Package_TO_SOT_SMD:SOT-23; Datasheet: http://www.tme.eu/fr/Document/ced3461ed31ea70a3c416fb648e0cde7/APE8865-3.pdf
pins: 1 VO, 2 GND, 3 VI

## APE8865NL-26-HF-3
designator *  value APE8865NL-26-HF-3  Reference: U
ki_keywords: 300mA LDO Regulator Fixed Positive; ki_description: 300mA Low Dropout Voltage Regulator, Fixed Output 2.6V, SOT-23; ki_fp_filters: SOT?23*; Footprint: Package_TO_SOT_SMD:SOT-23; Datasheet: http://www.tme.eu/fr/Document/ced3461ed31ea70a3c416fb648e0cde7/APE8865-3.pdf
pins: 1 VO, 2 GND, 3 VI

## APE8865NL-27-HF-3
designator *  value APE8865NL-27-HF-3  Reference: U
ki_keywords: 300mA LDO Regulator Fixed Positive; ki_description: 300mA Low Dropout Voltage Regulator, Fixed Output 2.7V, SOT-23; ki_fp_filters: SOT?23*; Footprint: Package_TO_SOT_SMD:SOT-23; Datasheet: http://www.tme.eu/fr/Document/ced3461ed31ea70a3c416fb648e0cde7/APE8865-3.pdf
pins: 1 VO, 2 GND, 3 VI

## APE8865NL-28-HF-3
designator *  value APE8865NL-28-HF-3  Reference: U
ki_keywords: 300mA LDO Regulator Fixed Positive; ki_description: 300mA Low Dropout Voltage Regulator, Fixed Output 2.8V, SOT-23; ki_fp_filters: SOT?23*; Footprint: Package_TO_SOT_SMD:SOT-23; Datasheet: http://www.tme.eu/fr/Document/ced3461ed31ea70a3c416fb648e0cde7/APE8865-3.pdf
pins: 1 VO, 2 GND, 3 VI

## APE8865NL-29-HF-3
designator *  value APE8865NL-29-HF-3  Reference: U
ki_keywords: 300mA LDO Regulator Fixed Positive; ki_description: 300mA Low Dropout Voltage Regulator, Fixed Output 2.9V, SOT-23; ki_fp_filters: SOT?23*; Footprint: Package_TO_SOT_SMD:SOT-23; Datasheet: http://www.tme.eu/fr/Document/ced3461ed31ea70a3c416fb648e0cde7/APE8865-3.pdf
pins: 1 VO, 2 GND, 3 VI

## APE8865NL-30-HF-3
designator *  value APE8865NL-30-HF-3  Reference: U
ki_keywords: 300mA LDO Regulator Fixed Positive; ki_description: 300mA Low Dropout Voltage Regulator, Fixed Output 3.0V, SOT-23; ki_fp_filters: SOT?23*; Footprint: Package_TO_SOT_SMD:SOT-23; Datasheet: http://www.tme.eu/fr/Document/ced3461ed31ea70a3c416fb648e0cde7/APE8865-3.pdf
pins: 1 VO, 2 GND, 3 VI

## APE8865NL-31-HF-3
designator *  value APE8865NL-31-HF-3  Reference: U
ki_keywords: 300mA LDO Regulator Fixed Positive; ki_description: 300mA Low Dropout Voltage Regulator, Fixed Output 3.1V, SOT-23; ki_fp_filters: SOT?23*; Footprint: Package_TO_SOT_SMD:SOT-23; Datasheet: http://www.tme.eu/fr/Document/ced3461ed31ea70a3c416fb648e0cde7/APE8865-3.pdf
pins: 1 VO, 2 GND, 3 VI

## APE8865NL-32-HF-3
designator *  value APE8865NL-32-HF-3  Reference: U
ki_keywords: 300mA LDO Regulator Fixed Positive; ki_description: 300mA Low Dropout Voltage Regulator, Fixed Output 3.2V, SOT-23; ki_fp_filters: SOT?23*; Footprint: Package_TO_SOT_SMD:SOT-23; Datasheet: http://www.tme.eu/fr/Document/ced3461ed31ea70a3c416fb648e0cde7/APE8865-3.pdf
pins: 1 VO, 2 GND, 3 VI

## APE8865NL-33-HF-3
designator *  value APE8865NL-33-HF-3  Reference: U
ki_keywords: 300mA LDO Regulator Fixed Positive; ki_description: 300mA Low Dropout Voltage Regulator, Fixed Output 3.3V, SOT-23; ki_fp_filters: SOT?23*; Footprint: Package_TO_SOT_SMD:SOT-23; Datasheet: http://www.tme.eu/fr/Document/ced3461ed31ea70a3c416fb648e0cde7/APE8865-3.pdf
pins: 1 VO, 2 GND, 3 VI

## APE8865NR-12-HF-3
designator *  value APE8865NR-12-HF-3  Reference: U
ki_keywords: 300mA LDO Regulator Fixed Positive; ki_description: 300mA Low Dropout Voltage Regulator, Fixed Output 1.2V, SOT-23; ki_fp_filters: SOT?23*; Footprint: Package_TO_SOT_SMD:SOT-23; Datasheet: http://www.tme.eu/fr/Document/ced3461ed31ea70a3c416fb648e0cde7/APE8865-3.pdf
pins: 1 VI, 2 VO, 3 GND

## APE8865NR-15-HF-3
designator *  value APE8865NR-15-HF-3  Reference: U
ki_keywords: 300mA LDO Regulator Fixed Positive; ki_description: 300mA Low Dropout Voltage Regulator, Fixed Output 1.5V, SOT-23; ki_fp_filters: SOT?23*; Footprint: Package_TO_SOT_SMD:SOT-23; Datasheet: http://www.tme.eu/fr/Document/ced3461ed31ea70a3c416fb648e0cde7/APE8865-3.pdf
pins: 1 VI, 2 VO, 3 GND

## APE8865NR-16-HF-3
designator *  value APE8865NR-16-HF-3  Reference: U
ki_keywords: 300mA LDO Regulator Fixed Positive; ki_description: 300mA Low Dropout Voltage Regulator, Fixed Output 1.6V, SOT-23; ki_fp_filters: SOT?23*; Footprint: Package_TO_SOT_SMD:SOT-23; Datasheet: http://www.tme.eu/fr/Document/ced3461ed31ea70a3c416fb648e0cde7/APE8865-3.pdf
pins: 1 VI, 2 VO, 3 GND

## APE8865NR-17-HF-3
designator *  value APE8865NR-17-HF-3  Reference: U
ki_keywords: 300mA LDO Regulator Fixed Positive; ki_description: 300mA Low Dropout Voltage Regulator, Fixed Output 1.7V, SOT-23; ki_fp_filters: SOT?23*; Footprint: Package_TO_SOT_SMD:SOT-23; Datasheet: http://www.tme.eu/fr/Document/ced3461ed31ea70a3c416fb648e0cde7/APE8865-3.pdf
pins: 1 VI, 2 VO, 3 GND

## APE8865NR-18-HF-3
designator *  value APE8865NR-18-HF-3  Reference: U
ki_keywords: 300mA LDO Regulator Fixed Positive; ki_description: 300mA Low Dropout Voltage Regulator, Fixed Output 1.8V, SOT-23; ki_fp_filters: SOT?23*; Footprint: Package_TO_SOT_SMD:SOT-23; Datasheet: http://www.tme.eu/fr/Document/ced3461ed31ea70a3c416fb648e0cde7/APE8865-3.pdf
pins: 1 VI, 2 VO, 3 GND